# Altium footprint library 6-Connectors-2.PcbLib: 57 footprints (part 2 of 7)
Each footprint in its own frame and in the unit in brackets; x right, y up, seen from the top. Pads: shape width x height; smd on the part's side, far side on the other; paste and mask are expansions set on the pad; w line width, h text height; cw(c..) or ccw(c..) is an arc to the next point about the centre after c.
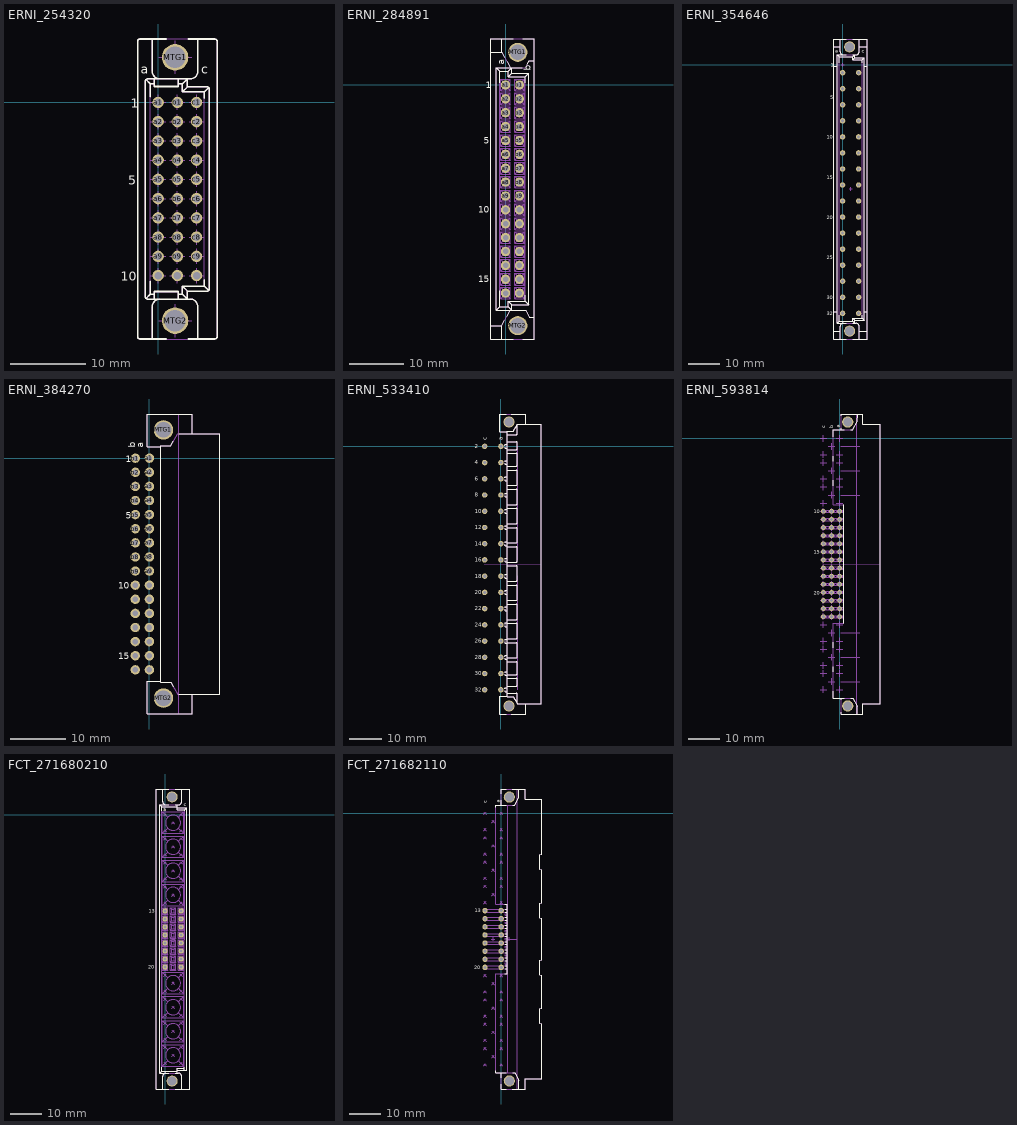
[diagram p1: the footprints below, top view; thin cyan lines are the x and y axes]

## ERNI_254320 [mm] "Connector; DIN 41612, Type C/3, Thru-Hole; Rows a+b+c, 30 Female Contacts"
height 11.6
pads (32):
  round 1.5 hole 1: a1(0,0) a2(0,-2.54) a3(0,-5.08) a4(0,-7.62) a5(0,-10.16) a6(0,-12.7) a7(0,-15.24) a8(0,-17.78) a9(0,-20.32) a10(0,-22.86) b1(2.54,0) b2(2.54,-2.54) b3(2.54,-5.08) b4(2.54,-7.62) b5(2.54,-10.16) b6(2.54,-12.7) b7(2.54,-15.24) b8(2.54,-17.78) b9(2.54,-20.32) b10(2.54,-22.86) c1(5.08,0) c2(5.08,-2.54) c3(5.08,-5.08) c4(5.08,-7.62) c5(5.08,-10.16) c6(5.08,-12.7) c7(5.08,-15.24) c8(5.08,-17.78) c9(5.08,-20.32) c10(5.08,-22.86)
  round 3.5 / inner round 3.5 / far side round 5.1 hole 2.8: MTG1(2.24,5.95) MTG2(2.24,-28.81)
Top Overlay:
  lines w0.2: -2.71,-29.139 -2.71,-28.996 -2.71,-28.643 -2.71,-28.5 ; -1.597,-25.872 -1.035,-25.31 ; -1.597,3.012 -1.035,2.45 ; -1.035,-23.6 -1.035,-25.31 ; -1.035,0.74 -1.035,2.45 ; -0.76,-31.23 -0.76,-26.96 cw(c0.24,-26.96) 0.24,-25.96 ; -0.76,8.37 -0.76,4.1 ccw(c0.24,4.1) 0.24,3.1 ; -0.485,-25.31 -1.035,-25.31 ; -0.485,2.45 -1.035,2.45 ; 1.08,-31.23 -2.41,-31.23 cw(c-2.41,-30.93) -2.71,-30.93 -2.71,8.07 cw(c-2.41,8.07) -2.41,8.37 1.08,8.37 ; 2.665,-25.96 2.665,-24.96 -0.485,-24.96 -0.485,-25.96 ; 2.665,-25.31 3.215,-25.31 ; 2.665,2.45 3.215,2.45 ; 2.665,3.1 2.665,2.1 -0.485,2.1 -0.485,3.1 ; 3.565,-25.96 ccw(c3.565,-25.66) 3.865,-25.66 3.865,-24.91 ; 3.565,3.1 cw(c3.565,2.8) 3.865,2.8 3.865,2.05 ; 3.777,-25.872 3.215,-25.31 ; 3.777,3.012 3.215,2.45 ; 4,-31.23 7.49,-31.23 ccw(c7.49,-30.93) 7.79,-30.93 7.79,8.07 ccw(c7.49,8.07) 7.49,8.37 4,8.37 ; 5.24,-31.23 5.24,-26.96 ccw(c4.24,-26.96) 4.24,-25.96 0.24,-25.96 ; 5.24,8.37 5.24,4.1 cw(c4.24,4.1) 4.24,3.1 0.24,3.1 ; 6.115,-23.425 6.115,-24.26 ; 6.115,0.565 6.115,1.4 ; 6.677,-24.822 6.115,-24.26 ; 6.677,1.962 6.115,1.4 ; 7.79,-29.139 7.79,-28.643 ; 7.79,5.64 7.79,5.783 ; -0.485,-25.96 0.24,-25.96 ; -0.485,-25.96 -1.385,-25.96 cw(c-1.385,-25.66) -1.685,-25.66 -1.685,-22.11 -1.685,-0.75 -1.685,2.8 cw(c-1.385,2.8) -1.385,3.1 -0.485,3.1 ; -0.485,3.1 0.24,3.1 ; 3.215,-25.31 3.215,-24.26 ; 3.215,-24.26 6.115,-24.26 ; 3.215,-24.26 3.865,-24.91 ; 3.215,1.4 6.115,1.4 ; 3.215,1.4 3.215,2.45 ; 3.215,1.4 3.865,2.05 ; 3.865,-24.91 6.465,-24.91 ccw(c6.465,-24.61) 6.765,-24.61 6.765,-22.11 6.765,-0.75 6.765,1.75 ccw(c6.465,1.75) 6.465,2.05 3.865,2.05
  text "c" at 5.715,3.81 h1.2
  text "a" at -2.286,3.81 h1.2
  text "1" at -3.585,-0.725 h1.2
  text "5" at -3.92,-10.885 h1.2
  text "10" at -4.918,-23.535 h1.2
Mechanical 8:
  lines w0.1: -1,-22.86 0,-22.86 ; -1,-20.32 0,-20.32 ; -1,-17.78 0,-17.78 ; -1,-15.24 0,-15.24 ; -1,-12.7 0,-12.7 ; -1,-10.16 0,-10.16 ; -1,-7.62 0,-7.62 ; -1,-5.08 0,-5.08 ; -1,-2.54 0,-2.54 ; -1,0 0,0 ; 0,-23.86 0,-22.86 ; 0,-21.86 0,-22.86 ; 0,-21.32 0,-20.32 ; 0,-19.32 0,-20.32 ; 0,-18.78 0,-17.78 ; 0,-16.78 0,-17.78 ; 0,-16.24 0,-15.24 ; 0,-14.24 0,-15.24 ; 0,-13.7 0,-12.7 ; 0,-11.7 0,-12.7 ; 0,-11.16 0,-10.16 ; 0,-9.16 0,-10.16 ; 0,-8.62 0,-7.62 ; 0,-6.62 0,-7.62 ; 0,-6.08 0,-5.08 ; 0,-4.08 0,-5.08 ; 0,-3.54 0,-2.54 ; 0,-1.54 0,-2.54 ; 0,-1 0,0 ; 0,1 0,0 ; 1,-22.86 0,-22.86 ; 1,-20.32 0,-20.32 ; 1,-17.78 0,-17.78 ; 1,-15.24 0,-15.24 ; 1,-12.7 0,-12.7 ; 1,-10.16 0,-10.16 ; 1,-7.62 0,-7.62 ; 1,-5.08 0,-5.08 ; 1,-2.54 0,-2.54 ; 1,0 0,0 ; 1.24,-28.81 2.24,-28.81 ; 1.24,5.95 2.24,5.95 ; 1.54,-22.86 2.54,-22.86 ; 1.54,-20.32 2.54,-20.32 ; 1.54,-17.78 2.54,-17.78 ; 1.54,-15.24 2.54,-15.24 ; 1.54,-12.7 2.54,-12.7 ; 1.54,-10.16 2.54,-10.16 ; 1.54,-7.62 2.54,-7.62 ; 1.54,-5.08 2.54,-5.08 ; 1.54,-2.54 2.54,-2.54 ; 1.54,0 2.54,0 ; 2.24,-29.81 2.24,-28.81 ; 2.24,-27.81 2.24,-28.81 ; 2.24,4.95 2.24,5.95 ; 2.24,6.95 2.24,5.95 ; 2.54,-23.86 2.54,-22.86 ; 2.54,-21.86 2.54,-22.86 ; 2.54,-21.32 2.54,-20.32 ; 2.54,-19.32 2.54,-20.32 ; 2.54,-18.78 2.54,-17.78 ; 2.54,-16.78 2.54,-17.78 ; 2.54,-16.24 2.54,-15.24 ; 2.54,-14.24 2.54,-15.24 ; 2.54,-13.7 2.54,-12.7 ; 2.54,-11.7 2.54,-12.7 ; 2.54,-11.16 2.54,-10.16 ; 2.54,-9.16 2.54,-10.16 ; 2.54,-8.62 2.54,-7.62 ; 2.54,-6.62 2.54,-7.62 ; 2.54,-6.08 2.54,-5.08 ; 2.54,-4.08 2.54,-5.08 ; 2.54,-3.54 2.54,-2.54 ; 2.54,-1.54 2.54,-2.54 ; 2.54,-1 2.54,0 ; 2.54,1 2.54,0 ; 3.24,-28.81 2.24,-28.81 ; 3.24,5.95 2.24,5.95 ; 3.54,-22.86 2.54,-22.86 ; 3.54,-20.32 2.54,-20.32 ; 3.54,-17.78 2.54,-17.78 ; 3.54,-15.24 2.54,-15.24 ; 3.54,-12.7 2.54,-12.7 ; 3.54,-10.16 2.54,-10.16 ; 3.54,-7.62 2.54,-7.62 ; 3.54,-5.08 2.54,-5.08 ; 3.54,-2.54 2.54,-2.54 ; 3.54,0 2.54,0 ; 4.08,-22.86 5.08,-22.86 ; 4.08,-20.32 5.08,-20.32 ; 4.08,-17.78 5.08,-17.78 ; 4.08,-15.24 5.08,-15.24 ; 4.08,-12.7 5.08,-12.7 ; 4.08,-10.16 5.08,-10.16 ; 4.08,-7.64 5.08,-7.64 ; 4.08,-5.08 5.08,-5.08 ; 4.08,-2.54 5.08,-2.54 ; 4.08,0 5.08,0 ; 5.08,-23.86 5.08,-22.86 ; 5.08,-21.86 5.08,-22.86 ; 5.08,-21.32 5.08,-20.32 ; 5.08,-19.32 5.08,-20.32 ; 5.08,-18.78 5.08,-17.78 ; 5.08,-16.78 5.08,-17.78 ; 5.08,-16.24 5.08,-15.24 ; 5.08,-14.24 5.08,-15.24 ; 5.08,-13.7 5.08,-12.7 ; 5.08,-11.7 5.08,-12.7 ; 5.08,-11.16 5.08,-10.16 ; 5.08,-9.16 5.08,-10.16 ; 5.08,-8.64 5.08,-7.64 ; 5.08,-6.64 5.08,-7.64 ; 5.08,-6.08 5.08,-5.08 ; 5.08,-4.08 5.08,-5.08 ; 5.08,-3.54 5.08,-2.54 ; 5.08,-1.54 5.08,-2.54 ; 5.08,-1 5.08,0 ; 5.08,1 5.08,0 ; 6.08,-22.86 5.08,-22.86 ; 6.08,-20.32 5.08,-20.32 ; 6.08,-17.78 5.08,-17.78 ; 6.08,-15.24 5.08,-15.24 ; 6.08,-12.7 5.08,-12.7 ; 6.08,-10.16 5.08,-10.16 ; 6.08,-7.64 5.08,-7.64 ; 6.08,-5.08 5.08,-5.08 ; 6.08,-2.54 5.08,-2.54 ; 6.08,0 5.08,0
Mechanical 14:
  circle w0.1: c2.24,5.95 r1.425
  circle w0.1: c2.24,-28.81 r1.425
  lines w0.1: -2.71,-29.139 -2.71,-28.996 -2.71,-28.643 -2.71,-28.5 ; -1.597,-25.872 -1.035,-25.31 ; -1.597,3.012 -1.035,2.45 ; -0.76,-31.23 -0.76,-26.96 cw(c0.24,-26.96) 0.24,-25.96 ; -0.76,8.37 -0.76,4.1 ccw(c0.24,4.1) 0.24,3.1 ; -0.485,-25.31 -1.035,-25.31 ; -0.485,2.45 -1.035,2.45 ; 0.065,-28.81 4.415,-28.81 ; 0.065,5.95 4.415,5.95 ; 2.24,-30.985 2.24,-26.635 ; 2.24,3.775 2.24,8.125 ; 2.665,-25.96 2.665,-24.96 -0.485,-24.96 -0.485,-25.96 ; 2.665,-25.31 3.215,-25.31 ; 2.665,2.45 3.215,2.45 ; 2.665,3.1 2.665,2.1 -0.485,2.1 -0.485,3.1 ; 3.565,-25.96 ccw(c3.565,-25.66) 3.865,-25.66 3.865,-24.91 ; 3.565,3.1 cw(c3.565,2.8) 3.865,2.8 3.865,2.05 ; 3.777,-25.872 3.215,-25.31 ; 3.777,3.012 3.215,2.45 ; 5.24,-31.23 5.24,-26.96 ccw(c4.24,-26.96) 4.24,-25.96 0.24,-25.96 ; 5.24,8.37 5.24,4.1 cw(c4.24,4.1) 4.24,3.1 0.24,3.1 ; 6.677,-24.822 6.115,-24.26 ; 6.677,1.962 6.115,1.4 ; 7.79,-29.139 7.79,-28.643 ; 7.79,5.64 7.79,5.783 ; -1.035,-25.31 -1.035,2.45 ; -0.485,-25.96 0.24,-25.96 ; -0.485,-25.96 -1.385,-25.96 cw(c-1.385,-25.66) -1.685,-25.66 -1.685,-22.11 -1.685,-0.75 -1.685,2.8 cw(c-1.385,2.8) -1.385,3.1 -0.485,3.1 ; -0.485,3.1 0.24,3.1 ; 3.215,-25.31 3.215,-24.26 ; 3.215,-24.26 6.115,-24.26 ; 3.215,-24.26 3.865,-24.91 ; 3.215,1.4 6.115,1.4 ; 3.215,1.4 3.215,2.45 ; 3.215,1.4 3.865,2.05 ; 3.865,-24.91 6.465,-24.91 ccw(c6.465,-24.61) 6.765,-24.61 6.765,-22.11 6.765,-0.75 6.765,1.75 ccw(c6.465,1.75) 6.465,2.05 3.865,2.05 ; 6.115,-24.26 6.115,1.4 ; -2.71,-30.93 ccw(c-2.41,-30.93) -2.41,-31.23 7.49,-31.23 ccw(c7.49,-30.93) 7.79,-30.93 7.79,8.07 ccw(c7.49,8.07) 7.49,8.37 -2.41,8.37 ccw(c-2.41,8.07) -2.71,8.07 -2.71,-30.93
  text "c" at 5.715,3.81 h1.2
  text "a" at -2.286,3.81 h1.2
  text "10" at -4.918,-23.535 h1.2
  text "1" at -3.585,-0.725 h1.2
  text "5" at -3.92,-10.885 h1.2
3D body "ERNI_254320.stp": height 11.6, standoff -4.5, extent -2.71,-31.23 7.79,8.37

## ERNI_284891 [mm] "DIN 41612, Type 2B, Thru-Hole Pressfit Terminations;  Rows a+b, 32 Positions, Performance level 2, Lead 4.5 mm, Pitch 2.54mm, Straight Female Connector"
height 11.6
pads (34):
  round 1.7 hole 1: a1(0,0) a2(0,-2.54) a3(0,-5.08) a4(0,-7.62) a5(0,-10.16) a6(0,-12.7) a7(0,-15.24) a8(0,-17.78) a9(0,-20.32) a10(0,-22.86) a11(0,-25.4) a12(0,-27.94) a13(0,-30.48) a14(0,-33.02) a15(0,-35.56) a16(0,-38.1) b1(2.54,0) b2(2.54,-2.54) b3(2.54,-5.08) b4(2.54,-7.62) b5(2.54,-10.16) b6(2.54,-12.7) b7(2.54,-15.24) b8(2.54,-17.78) b9(2.54,-20.32) b10(2.54,-22.86) b11(2.54,-25.4) b12(2.54,-27.94) b13(2.54,-30.48) b14(2.54,-33.02) b15(2.54,-35.56) b16(2.54,-38.1)
  round 3.5 / inner round 3.5 / far side round 5.1 hole 2.8: MTG1(2.24,5.95) MTG2(2.24,-44.05)
Top Overlay:
  lines w0.2: -2.73,-44.05 -0.71,-44.05 ; -2.73,5.95 -0.71,5.95 ; -1.08,-37.705 -1.08,-40.6 ; -1.08,0.395 -1.08,2.5 ; -0.71,-46.5 -0.71,-44.05 ; -0.71,8.4 -0.71,5.95 ; -0.214,-43.191 -0.71,-44.05 ; -0.214,5.091 -0.71,5.95 ; 0.269,-42.354 0.907,-41.25 3.653,-41.25 4.375,-42.5 5.27,-42.5 ; 0.269,4.254 0.907,3.15 3.025,3.15 ; 1.37,-46.5 -2.73,-46.5 -2.73,8.4 1.37,8.4 ; 3.11,-46.5 5.27,-46.5 5.27,8.4 3.11,8.4 ; 3.62,-38.495 3.62,-39.55 ; 3.62,0.395 3.62,1.45 ; 4.014,3.775 4.375,4.4 5.27,4.4 ; -1.73,-41.25 1.17,-41.25 ; -1.73,-41.25 -1.73,3.15 ; -1.73,-41.25 -1.08,-40.6 ; -1.73,3.15 1.17,3.15 ; -1.73,3.15 -1.08,2.5 ; -1.08,-40.6 0.52,-40.6 ; -1.08,2.5 0.52,2.5 ; 0.52,-40.6 0.52,-39.55 ; 0.52,-40.6 1.17,-41.25 ; 0.52,-39.55 3.62,-39.55 ; 0.52,-39.55 1.17,-40.2 ; 0.52,1.45 0.52,2.5 ; 0.52,1.45 3.62,1.45 ; 0.52,1.45 1.17,2.1 ; 0.52,2.5 1.17,3.15 ; 1.17,-41.25 1.17,-40.2 ; 1.17,-40.2 4.27,-40.2 ; 1.17,2.1 1.17,3.15 ; 1.17,2.1 4.27,2.1 ; 3.62,-39.55 4.27,-40.2 ; 3.62,1.45 4.27,2.1 ; 4.27,-40.2 4.27,2.1
  text "15" at -4.949,-36.13 h1.2
  text "1" at -3.64,-0.625 h1.2
  text "b" at 4.65,2.55 h1.2
  text "a" at -0.275,3.65 h1.2
  text "5" at -3.965,-10.785 h1.2
  text "10" at -4.949,-23.43 h1.2
Mechanical 8:
  lines w0.1: 0,-38.1 0,-37.6 0,-38.1 ; 0,-38.1 0.5,-38.1 0,-38.1 ; 0,-38.1 0,-38.6 0,-38.1 ; 0,-38.1 -0.5,-38.1 0,-38.1 ; 0,0 0,0.5 0,0 ; 0,0 0.5,0 0,0 ; 0,0 0,-0.5 0,0 ; 0,0 -0.5,0 0,0 ; 2.24,-44.05 2.24,-43.55 2.24,-44.05 ; 2.24,-44.05 2.74,-44.05 2.24,-44.05 ; 2.24,-44.05 2.24,-44.55 2.24,-44.05 ; 2.24,-44.05 1.74,-44.05 2.24,-44.05 ; 2.24,5.95 2.24,6.45 2.24,5.95 ; 2.24,5.95 2.74,5.95 2.24,5.95 ; 2.24,5.95 2.24,5.45 2.24,5.95 ; 2.24,5.95 1.74,5.95 2.24,5.95 ; 2.54,-38.1 2.54,-37.6 2.54,-38.1 ; 2.54,-38.1 3.04,-38.1 2.54,-38.1 ; 2.54,-38.1 2.54,-38.6 2.54,-38.1 ; 2.54,-38.1 2.04,-38.1 2.54,-38.1 ; 2.54,0 2.54,0.5 2.54,0 ; 2.54,0 3.04,0 2.54,0 ; 2.54,0 2.54,-0.5 2.54,0 ; 2.54,0 2.04,0 2.54,0
Mechanical 14:
  drawing of 426 lines, arcs and shapes, not listed
  text "15" at -4.949,-36.13 h1.2
  text "10" at -4.949,-23.43 h1.2
  text "5" at -3.965,-10.785 h1.2
  text "a" at -0.275,3.65 h1.2
  text "b" at 4.65,2.55 h1.2
  text "1" at -3.64,-0.625 h1.2
Drill Drawing:
  lines w0.1: -2.73,-39.5 -2.73,1.5 5.27,1.5 5.27,-39.5 -2.73,-39.5
  text "PRESS-FIT TECHNOLOGY diam. 1mm +0.09 -0.06" at -1.325,-37.125 h1
3D body "ERNI_284891.stp": height 11.6, standoff -4.5, extent -2.73,-46.5 5.27,8.4

## ERNI_354646 [mm] "DIN 41612, Type D, Thru-Hole Pressfit Termination; Rows a+c, 32 Position, Performance level 2, Lead 4.5mm, Pitch 5.08mm, Straight Female Connector"
height 11.6
pads (34):
  round 1.7 hole 1: a2(0,-2.54) a4(0,-7.62) a6(0,-12.7) a8(0,-17.78) a10(0,-22.86) a12(0,-27.94) a14(0,-33.02) a16(0,-38.1) a18(0,-43.18) a20(0,-48.26) a22(0,-53.34) a24(0,-58.42) a26(0,-63.5) a28(0,-68.58) a30(0,-73.66) a32(0,-78.74) c2(5.08,-2.54) c4(5.08,-7.62) c6(5.08,-12.7) c8(5.08,-17.78) c10(5.08,-22.86) c12(5.08,-27.94) c14(5.08,-33.02) c16(5.08,-38.1) c18(5.08,-43.18) c20(5.08,-48.26) c22(5.08,-53.34) c24(5.08,-58.42) c26(5.08,-63.5) c28(5.08,-68.58) c30(5.08,-73.66) c32(5.08,-78.74)
  round 3.5 / inner round 3.5 / far side round 5.1 hole 2.8: MTG1(2.24,5.63) MTG2(2.24,-84.37)
Top Overlay:
  lines w0.2: -2.76,-84.47 -0.76,-84.47 ; -2.76,-78.27 -1.71,-78.27 ; -2.76,-0.47 -1.71,-0.47 ; -2.76,5.73 -0.76,5.73 ; -1.11,-79.315 -1.11,-81.27 ; -1.11,0.575 -1.11,2.53 ; -0.76,-86.87 -0.76,-82.87 cw(c0.24,-82.87) 0.24,-81.87 1.22,-81.87 -1.71,-81.87 ; -0.76,8.13 -0.76,4.13 ccw(c0.24,4.13) 0.24,3.13 1.22,3.13 -1.71,3.13 ; 1.22,-86.87 -2.76,-86.87 -2.76,8.13 1.22,8.13 ; 3.26,-86.87 7.84,-86.87 7.84,8.13 3.26,8.13 ; 5.24,-86.87 5.24,-82.87 ccw(c4.24,-82.87) 4.24,-81.87 3.26,-81.87 3.79,-81.87 ; 5.24,-84.47 7.84,-84.47 ; 5.24,5.73 7.84,5.73 ; 5.24,8.13 5.24,4.13 cw(c4.24,4.13) 4.24,3.13 3.26,3.13 3.79,3.13 ; 6.19,-79.315 6.19,-80.27 ; 6.19,0.575 6.19,1.53 ; 6.79,-78.27 7.84,-78.27 ; 6.79,-0.47 7.84,-0.47 ; -1.71,-81.87 -1.71,3.13 ; -1.71,-81.87 -1.11,-81.27 ; -1.71,3.13 -1.11,2.53 ; -1.11,-81.27 3.19,-81.27 ; -1.11,2.53 3.19,2.53 ; 3.19,-81.27 3.19,-80.27 ; 3.19,-81.27 3.79,-81.87 ; 3.19,-80.27 6.19,-80.27 ; 3.19,-80.27 3.79,-80.87 ; 3.19,1.53 3.19,2.53 ; 3.19,1.53 6.19,1.53 ; 3.19,1.53 3.79,2.13 ; 3.19,2.53 3.79,3.13 ; 3.79,-81.87 3.79,-80.87 ; 3.79,-80.87 6.79,-80.87 ; 3.79,2.13 3.79,3.13 ; 3.79,2.13 6.79,2.13 ; 6.19,-80.27 6.79,-80.87 ; 6.19,1.53 6.79,2.13 ; 6.79,-80.87 6.79,2.13
  text "c" at 6.032,3.81 h1.2
  text "a" at -2.286,3.81 h1.2
  text "32" at -5.05,-79.415 h1.2
  text "5" at -3.925,-10.885 h1.2
  text "10" at -5.05,-23.535 h1.2
  text "30" at -5.05,-74.335 h1.2
  text "25" at -5.05,-61.635 h1.2
  text "20" at -5.05,-48.935 h1.2
  text "15" at -5.05,-36.235 h1.2
  text "1" at -3.725,-0.725 h1.2
Mechanical 8:
  lines w0.1: -0.5,-78.74 0,-78.74 ; -0.5,-73.66 0,-73.66 ; -0.5,-2.54 0,-2.54 ; -0.5,0 0,0 ; 0,-79.24 0,-78.74 ; 0,-78.24 0,-78.74 ; 0,-74.16 0,-73.66 ; 0,-73.16 0,-73.66 ; 0,-3.04 0,-2.54 ; 0,-2.04 0,-2.54 ; 0,-0.5 0,0 ; 0,0.5 0,0 ; 0.5,-78.74 0,-78.74 ; 0.5,-73.66 0,-73.66 ; 0.5,-2.54 0,-2.54 ; 0.5,0 0,0 ; 1.74,-84.37 2.24,-84.37 ; 1.74,5.63 2.24,5.63 ; 2.04,-39.37 2.54,-39.37 ; 2.24,-84.87 2.24,-84.37 ; 2.24,-83.87 2.24,-84.37 ; 2.24,5.13 2.24,5.63 ; 2.24,6.13 2.24,5.63 ; 2.54,-39.87 2.54,-39.37 ; 2.54,-38.87 2.54,-39.37 ; 2.74,-84.37 2.24,-84.37 ; 2.74,5.63 2.24,5.63 ; 3.04,-39.37 2.54,-39.37 ; 4.58,-78.74 5.08,-78.74 ; 4.58,-73.66 5.08,-73.66 ; 4.58,-2.54 5.08,-2.54 ; 5.08,-79.24 5.08,-78.74 ; 5.08,-78.24 5.08,-78.74 ; 5.08,-74.16 5.08,-73.66 ; 5.08,-73.16 5.08,-73.66 ; 5.08,-3.04 5.08,-2.54 ; 5.08,-2.04 5.08,-2.54 ; 5.58,-78.74 5.08,-78.74 ; 5.58,-73.66 5.08,-73.66 ; 5.58,-2.54 5.08,-2.54
Mechanical 14:
  circle w0.1: c2.24,-84.37 r1.4
  circle w0.1: c2.24,5.63 r1.4
  circle w0.1: c2.24,-84.37 r1.425
  circle w0.1: c2.24,5.63 r1.425
  lines w0.1: -2.76,-84.47 -0.76,-84.47 ; -2.76,-78.27 -1.71,-78.27 ; -2.76,-0.47 -1.71,-0.47 ; -2.76,5.73 -0.76,5.73 ; -0.76,-86.87 -0.76,-82.87 cw(c0.24,-82.87) 0.24,-81.87 4.24,-81.87 cw(c4.24,-82.87) 5.24,-82.87 5.24,-86.87 ; -0.76,8.13 -0.76,4.13 ccw(c0.24,4.13) 0.24,3.13 4.24,3.13 ccw(c4.24,4.13) 5.24,4.13 5.24,8.13 ; 5.24,-84.47 7.84,-84.47 ; 5.24,5.73 7.84,5.73 ; 6.79,-78.27 7.84,-78.27 ; 6.79,-0.47 7.84,-0.47 ; -1.71,-81.87 3.79,-81.87 ; -1.71,-81.87 -1.71,3.13 ; -1.71,-81.87 -1.11,-81.27 ; -1.71,3.13 3.79,3.13 ; -1.71,3.13 -1.11,2.53 ; -1.11,-81.27 3.19,-81.27 ; -1.11,-81.27 -1.11,2.53 ; -1.11,2.53 3.19,2.53 ; 3.19,-81.27 3.19,-80.27 ; 3.19,-81.27 3.79,-81.87 ; 3.19,-80.27 6.19,-80.27 ; 3.19,-80.27 3.79,-80.87 ; 3.19,1.53 3.19,2.53 ; 3.19,1.53 6.19,1.53 ; 3.19,1.53 3.79,2.13 ; 3.19,2.53 3.79,3.13 ; 3.79,-81.87 3.79,-80.87 ; 3.79,-80.87 6.79,-80.87 ; 3.79,2.13 3.79,3.13 ; 3.79,2.13 6.79,2.13 ; 6.19,-80.27 6.19,1.53 ; 6.19,-80.27 6.79,-80.87 ; 6.19,1.53 6.79,2.13 ; 6.79,-80.87 6.79,2.13 ; -2.76,-86.87 7.84,-86.87 7.84,8.13 -2.76,8.13 -2.76,-86.87
  text "1" at -3.725,-0.725 h1.2
  text "c" at 6.032,3.81 h1.2
  text "a" at -2.286,3.81 h1.2
  text "32" at -5.05,-79.415 h1.2
  text "5" at -3.925,-10.885 h1.2
  text "10" at -5.05,-23.535 h1.2
  text "15" at -5.05,-36.235 h1.2
  text "20" at -5.05,-48.935 h1.2
  text "25" at -5.05,-61.635 h1.2
  text "30" at -5.05,-74.335 h1.2
Drill Drawing:
  lines w0.1: -2.54,-58.42 -2.54,-81.28 7.62,-81.28 7.62,0 -2.54,0 -2.54,-20.32
  text "PRESS-FIT TECHNOLOGY diam. 1mm +0.09 -0.06" at -1.905,-56.515 h1
3D body "ERNI_354646.stp": height 11.5, standoff -4.3, extent -2.76,-86.87 7.84,8.13

## ERNI_384270 [mm] "DIN 41612, Type 2B, Thru-Hole Pressfit Terminations;  Rows a+b, 32 Positions, Performance Class 2, Lead 3 mm, Pitch 2.54mm, Right Angle Male Connector"
height 8.6
pads (34):
  round 1.7 hole 1: a1(0,0) a2(0,-2.54) a3(0,-5.08) a4(0,-7.62) a5(0,-10.16) a6(0,-12.7) a7(0,-15.24) a8(0,-17.78) a9(0,-20.32) a10(0,-22.86) a11(0,-25.4) a12(0,-27.94) a13(0,-30.48) a14(0,-33.02) a15(0,-35.56) a16(0,-38.1) b1(-2.54,0) b2(-2.54,-2.54) b3(-2.54,-5.08) b4(-2.54,-7.62) b5(-2.54,-10.16) b6(-2.54,-12.7) b7(-2.54,-15.24) b8(-2.54,-17.78) b9(-2.54,-20.32) b10(-2.54,-22.86) b11(-2.54,-25.4) b12(-2.54,-27.94) b13(-2.54,-30.48) b14(-2.54,-33.02) b15(-2.54,-35.56) b16(-2.54,-38.1)
  round 3.5 / inner round 3.5 / far side round 5.1 hole 2.8: MTG1(2.54,5.08) MTG2(2.54,-43.18)
Top Overlay:
  lines w0.2: 2.04,-40.18 -0.36,-40.18 -0.36,-46.05 7.69,-46.05 7.69,-42.5 ; 2.04,2.08 -0.36,2.08 -0.36,7.95 7.69,7.95 7.69,4.4 ; 4.32,-41.15 3.847,-40.33 2.04,-40.33 2.04,2.23 3.847,2.23 4.32,3.05 ; 5.3,-42.5 12.64,-42.5 12.64,4.4 5.3,4.4
  text "10" at -5.58,-23.535 h1.2
  text "5" at -4.255,-10.885 h1.2
  text "a" at -1.12,1.87 h1.2
  text "b" at -2.56,1.87 h1.2
  text "1" at -4.255,-0.725 h1.2
  text "15" at -5.58,-36.235 h1.2
Mechanical 8:
  drawing of 209 lines, arcs and shapes, not listed
  text "PCB" at 5.055,-19.45 h1.2
Mechanical 14:
  circle w0.1: c2.54,-43.18 r1.25
  circle w0.1: c2.54,5.08 r1.25
  lines w0.1: 2.04,-40.18 -0.36,-40.18 -0.36,-46.05 7.69,-46.05 7.69,-42.5 ; 2.04,2.08 -0.36,2.08 -0.36,7.95 7.69,7.95 7.69,4.4 ; 2.04,-40.33 2.04,2.23 3.847,2.23 5.1,4.4 12.64,4.4 12.64,-42.5 5.1,-42.5 3.847,-40.33 2.04,-40.33
  text "5" at -4.255,-10.885 h1.2
  text "1" at -4.255,-0.725 h1.2
  text "10" at -5.58,-23.535 h1.2
  text "15" at -5.58,-36.235 h1.2
Drill Drawing:
  lines w0.1: -3.9,-40.33 -3.9,2.08 1.4,2.08 1.4,-40.33 -3.9,-40.33
  text "PRESS-FIT TECHNOLOGY diam. 1mm +0.09 -0.06" at 3,-37.1 h1
3D body "v160-080.stp": height 0.02, standoff -1.65, extent -0.8,-38.9 0.8,-37.3
3D body "v160-080.stp": height 0.02, standoff -1.65, extent -3.34,-38.9 -1.74,-37.3
3D body "v160-080.stp": height 0.02, standoff -1.65, extent -0.8,-36.36 0.8,-34.76
3D body "v160-080.stp": height 0.02, standoff -1.65, extent -3.34,-36.36 -1.74,-34.76
3D body "v160-080.stp": height 0.02, standoff -1.65, extent -0.8,-33.82 0.8,-32.22
3D body "v160-080.stp": height 0.02, standoff -1.65, extent -3.34,-33.82 -1.74,-32.22
3D body "v160-080.stp": height 0.02, standoff -1.65, extent -0.8,-31.28 0.8,-29.68
3D body "v160-080.stp": height 0.02, standoff -1.65, extent -3.34,-31.28 -1.74,-29.68
3D body "v160-080.stp": height 0.02, standoff -1.65, extent -0.8,-28.74 0.8,-27.14
3D body "v160-080.stp": height 0.02, standoff -1.65, extent -3.34,-28.74 -1.74,-27.14
3D body "v160-080.stp": height 0.02, standoff -1.65, extent -0.8,-26.2 0.8,-24.6
3D body "v160-080.stp": height 0.02, standoff -1.65, extent -3.34,-26.2 -1.74,-24.6
3D body "v160-080.stp": height 0.02, standoff -1.65, extent -0.8,-23.66 0.8,-22.06
3D body "v160-080.stp": height 0.02, standoff -1.65, extent -3.34,-23.66 -1.74,-22.06
3D body "v160-080.stp": height 0.02, standoff -1.65, extent -0.8,-21.12 0.8,-19.52
3D body "v160-080.stp": height 0.02, standoff -1.65, extent -3.34,-21.12 -1.74,-19.52
3D body "v160-080.stp": height 0.02, standoff -1.65, extent -0.8,-18.58 0.8,-16.98
3D body "v160-080.stp": height 0.02, standoff -1.65, extent -3.34,-18.58 -1.74,-16.98
3D body "v160-080.stp": height 0.02, standoff -1.65, extent -0.8,-16.04 0.8,-14.44
3D body "v160-080.stp": height 0.02, standoff -1.65, extent -3.34,-16.04 -1.74,-14.44
3D body "v160-080.stp": height 0.02, standoff -1.65, extent -0.8,-13.5 0.8,-11.9
3D body "v160-080.stp": height 0.02, standoff -1.65, extent -3.34,-13.5 -1.74,-11.9
3D body "v160-080.stp": height 0.02, standoff -1.65, extent -0.8,-10.96 0.8,-9.36
3D body "v160-080.stp": height 0.02, standoff -1.65, extent -3.34,-10.96 -1.74,-9.36
3D body "v160-080.stp": height 0.02, standoff -1.65, extent -0.8,-8.42 0.8,-6.82
3D body "v160-080.stp": height 0.02, standoff -1.65, extent -3.34,-8.42 -1.74,-6.82
3D body "v160-080.stp": height 0.02, standoff -1.65, extent -0.8,-5.88 0.8,-4.28
3D body "v160-080.stp": height 0.02, standoff -1.65, extent -3.34,-5.88 -1.74,-4.28
3D body "v160-080.stp": height 0.02, standoff -1.65, extent -0.8,-3.34 0.8,-1.74
3D body "v160-080.stp": height 0.02, standoff -1.65, extent -3.34,-3.34 -1.74,-1.74
3D body "v160-080.stp": height 0.02, standoff -1.65, extent -0.8,-0.8 0.8,0.8
3D body "v160-080.stp": height 0.02, standoff -1.65, extent -3.34,-0.8 -1.74,0.8
3D body "ERNI_384270.stp": height 6.83, standoff -3, extent -2.79,-46.05 12.64,7.95

## ERNI_533410 [mm] "Eurocard DIN 41612, Type C, 32 Position, Rows a+c, Performance level 2, Male, Lead 3.0 mm, Pitch 2.54 mm"
height 11
pads (34):
  round 1.7 hole 1: a2(0,0) a4(0,-5.08) a6(0,-10.16) a8(0,-15.24) a10(0,-20.32) a12(0,-25.4) a14(0,-30.48) a16(0,-35.56) a18(0,-40.64) a20(0,-45.72) a22(0,-50.8) a24(0,-55.88) a26(0,-60.96) a28(0,-66.04) a30(0,-71.12) a32(0,-76.2) c2(-5.08,0) c4(-5.08,-5.08) c6(-5.08,-10.16) c8(-5.08,-15.24) c10(-5.08,-20.32) c12(-5.08,-25.4) c14(-5.08,-30.48) c16(-5.08,-35.56) c18(-5.08,-40.64) c20(-5.08,-45.72) c22(-5.08,-50.8) c24(-5.08,-55.88) c26(-5.08,-60.96) c28(-5.08,-66.04) c30(-5.08,-71.12) c32(-5.08,-76.2)
  round 3.5 / inner round 3.5 / far side round 5.1 hole 2.8: MTG1(2.54,7.62) MTG2(2.54,-81.28)
Top Overlay:
  drawing of 163 lines, arcs and shapes, not listed
  text "2" at -8.12,-0.575 h1.2
  text "4" at -8.12,-5.655 h1.2
  text "6" at -8.12,-10.735 h1.2
  text "8" at -8.22,-15.815 h1.2
  text "12" at -8.22,-25.975 h1.2
  text "14" at -8.22,-31.055 h1.2
  text "16" at -8.22,-36.135 h1.2
  text "18" at -8.22,-41.215 h1.2
  text "22" at -8.22,-51.375 h1.2
  text "24" at -8.22,-56.455 h1.2
  text "26" at -8.22,-61.535 h1.2
  text "c" at -4.445,1.905 h1.2
  text "a" at 0.635,1.905 h1.2
  text "32" at -8.22,-76.775 h1.2
  text "10" at -8.22,-20.895 h1.2
  text "20" at -8.22,-46.295 h1.2
  text "28" at -8.22,-66.615 h1.2
  text "30" at -8.22,-71.695 h1.2
Mechanical 8:
  lines w0.1: -5.08,-36.83 12.64,-36.83
  text "PCB" at 5.08,-38.735 h1.2
Mechanical 14:
  drawing of 163 lines, arcs and shapes, not listed
  text "PCB" at 6.05,-40.1 h1.2
  text "a" at 0.635,1.905 h1.2
  text "c" at -4.445,1.905 h1.2
  text "30" at -8.22,-71.695 h1.2
  text "28" at -8.22,-66.615 h1.2
  text "20" at -8.22,-46.295 h1.2
  text "10" at -8.22,-20.895 h1.2
  text "32" at -8.22,-76.775 h1.2
  text "26" at -8.22,-61.535 h1.2
  text "24" at -8.22,-56.455 h1.2
  text "22" at -8.22,-51.375 h1.2
  text "18" at -8.22,-41.215 h1.2
  text "16" at -8.22,-36.135 h1.2
  text "14" at -8.22,-31.055 h1.2
  text "12" at -8.22,-25.975 h1.2
  text "8" at -8.22,-15.815 h1.2
  text "6" at -8.12,-10.735 h1.2
  text "4" at -8.12,-5.655 h1.2
  text "2" at -8.12,-0.575 h1.2
3D body "v160-080.stp": height 0.02, standoff -1.65, extent -0.8,-77 0.8,-75.4
3D body "v160-080.stp": height 0.02, standoff -1.65, extent -5.88,-77 -4.28,-75.4
3D body "v160-080.stp": height 0.02, standoff -1.65, extent -0.8,-71.92 0.8,-70.32
3D body "v160-080.stp": height 0.02, standoff -1.65, extent -5.88,-71.92 -4.28,-70.32
3D body "v160-080.stp": height 0.02, standoff -1.65, extent -0.8,-66.84 0.8,-65.24
3D body "v160-080.stp": height 0.02, standoff -1.65, extent -5.88,-66.84 -4.28,-65.24
3D body "v160-080.stp": height 0.02, standoff -1.65, extent -0.8,-61.76 0.8,-60.16
3D body "v160-080.stp": height 0.02, standoff -1.65, extent -5.88,-61.76 -4.28,-60.16
3D body "v160-080.stp": height 0.02, standoff -1.65, extent -0.8,-56.68 0.8,-55.08
3D body "v160-080.stp": height 0.02, standoff -1.65, extent -5.88,-56.68 -4.28,-55.08
3D body "v160-080.stp": height 0.02, standoff -1.65, extent -0.8,-51.6 0.8,-50
3D body "v160-080.stp": height 0.02, standoff -1.65, extent -5.88,-51.6 -4.28,-50
3D body "v160-080.stp": height 0.02, standoff -1.65, extent -0.8,-46.52 0.8,-44.92
3D body "v160-080.stp": height 0.02, standoff -1.65, extent -5.88,-46.52 -4.28,-44.92
3D body "v160-080.stp": height 0.02, standoff -1.65, extent -0.8,-41.44 0.8,-39.84
3D body "v160-080.stp": height 0.02, standoff -1.65, extent -5.88,-41.44 -4.28,-39.84
3D body "v160-080.stp": height 0.02, standoff -1.65, extent -0.8,-36.36 0.8,-34.76
3D body "v160-080.stp": height 0.02, standoff -1.65, extent -5.88,-36.36 -4.28,-34.76
3D body "v160-080.stp": height 0.02, standoff -1.65, extent -0.8,-31.28 0.8,-29.68
3D body "v160-080.stp": height 0.02, standoff -1.65, extent -5.88,-31.28 -4.28,-29.68
3D body "v160-080.stp": height 0.02, standoff -1.65, extent -0.8,-26.2 0.8,-24.6
3D body "v160-080.stp": height 0.02, standoff -1.65, extent -5.88,-26.2 -4.28,-24.6
3D body "v160-080.stp": height 0.02, standoff -1.65, extent -0.8,-21.12 0.8,-19.52
3D body "v160-080.stp": height 0.02, standoff -1.65, extent -5.88,-21.12 -4.28,-19.52
3D body "v160-080.stp": height 0.02, standoff -1.65, extent -0.8,-16.04 0.8,-14.44
3D body "v160-080.stp": height 0.02, standoff -1.65, extent -5.88,-16.04 -4.28,-14.44
3D body "v160-080.stp": height 0.02, standoff -1.65, extent -0.8,-10.96 0.8,-9.36
3D body "v160-080.stp": height 0.02, standoff -1.65, extent -5.88,-10.96 -4.28,-9.36
3D body "v160-080.stp": height 0.02, standoff -1.65, extent -0.8,-5.88 0.8,-4.28
3D body "v160-080.stp": height 0.02, standoff -1.65, extent -5.88,-5.88 -4.28,-4.28
3D body "v160-080.stp": height 0.02, standoff -1.65, extent -0.8,-0.8 0.8,0.8
3D body "v160-080.stp": height 0.02, standoff -1.65, extent -5.88,-0.8 -4.28,0.8
3D body "ERNI_533410.stp": height 9.4, standoff -3, extent -5.38,-83.83 12.64,10.17

## ERNI_593814 [mm] "DIN 41612, Type M, 42 Contacts + 6 Spares  Positions for Specials Contacts, Right Angle Male Connector, Pitch 2.54 mm"
height 11
pads (44):
  round 1.5 hole 1: a10(0,-22.86) a11(0,-25.4) a12(0,-27.94) a13(0,-30.48) a14(0,-33.02) a15(0,-35.56) a16(0,-38.1) a17(0,-40.64) a18(0,-43.18) a19(0,-45.72) a20(0,-48.26) a21(0,-50.8) a22(0,-53.34) a23(0,-55.88) b10(-2.54,-22.86) b11(-2.54,-25.4) b12(-2.54,-27.94) b13(-2.54,-30.48) b14(-2.54,-33.02) b15(-2.54,-35.56) b16(-2.54,-38.1) b17(-2.54,-40.64) b18(-2.54,-43.18) b19(-2.54,-45.72) b20(-2.54,-48.26) b21(-2.54,-50.8) b22(-2.54,-53.34) b23(-2.54,-55.88) c10(-5.08,-22.86) c11(-5.08,-25.4) c12(-5.08,-27.94) c13(-5.08,-30.48) c14(-5.08,-33.02) c15(-5.08,-35.56) c16(-5.08,-38.1) c17(-5.08,-40.64) c18(-5.08,-43.18) c19(-5.08,-45.72) c20(-5.08,-48.26) c21(-5.08,-50.8) c22(-5.08,-53.34) c23(-5.08,-55.88)
  round 3.5 / inner round 3.5 / far side round 5.1 hole 2.8: MTG1(2.54,5.08) MTG2(2.54,-83.82)
Top Overlay:
  lines w0.2: -1.965,0.46 -1.96,2.63 1.5,2.63 ; -1.963,-73.2 -1.96,-71.58 ; -1.963,-65.58 -1.96,-63.96 ; -1.963,-14.78 -1.96,-13.16 ; -1.963,-7.16 -1.96,-5.54 ; -1.955,-79.2 -1.96,-81.37 1.5,-81.37 ; 0.54,-85.857 0.54,-86.37 7.24,-86.37 7.24,-83.17 12.74,-83.17 12.74,4.43 7.24,4.43 7.24,7.63 0.54,7.63 0.54,7.117 ; 0.54,-81.883 0.54,-81.37 ; 0.54,2.63 0.54,3.143 ; 1.29,-57.94 1.29,-20.8 ; 3.5,-81.37 4.04,-81.37 5.54,-83.87 5.54,-86.37 ; 3.5,2.63 4.04,2.63 5.54,5.13 5.64,7.63
  text "c" at -4.58,3.22 h1.2
  text "b" at -2.04,3.22 h1.2
  text "a" at 0,3.302 h1.2
  text "10" at -8.12,-23.535 h1.2
  text "15" at -8.12,-36.235 h1.2
  text "20" at -8.12,-48.935 h1.2
Mechanical 8:
  drawing of 314 lines, arcs and shapes, not listed
  text "PCB" at 5.08,-41.275 h1.2
Mechanical 14:
  lines w0.1: 0.54,-81.37 0.54,-86.37 7.24,-86.37 7.24,-83.17 12.74,-83.17 12.74,4.43 7.24,4.43 7.24,7.63 0.54,7.63 0.54,2.63 ; 1.29,-56.23 -5.38,-56.23 -5.38,-55.53 1.295,-55.53 ; 1.29,-53.69 -5.38,-53.69 -5.38,-52.99 1.295,-52.99 ; 1.29,-51.15 -5.38,-51.15 -5.38,-50.45 1.295,-50.45 ; 1.29,-48.61 -5.38,-48.61 -5.38,-47.91 1.295,-47.91 ; 1.29,-46.07 -5.38,-46.07 -5.38,-45.37 1.295,-45.37 ; 1.29,-43.53 -5.38,-43.53 -5.38,-42.83 1.295,-42.83 ; 1.29,-40.99 -5.38,-40.99 -5.38,-40.29 1.295,-40.29 ; 1.29,-38.45 -5.38,-38.45 -5.38,-37.75 1.295,-37.75 ; 1.29,-35.91 -5.38,-35.91 -5.38,-35.21 1.295,-35.21 ; 1.29,-33.37 -5.38,-33.37 -5.38,-32.67 1.295,-32.67 ; 1.29,-30.83 -5.38,-30.83 -5.38,-30.13 1.295,-30.13 ; 1.29,-28.29 -5.38,-28.29 -5.38,-27.59 1.295,-27.59 ; 1.29,-25.75 -5.38,-25.75 -5.38,-25.05 1.295,-25.05 ; 1.29,-23.21 -5.38,-23.21 -5.38,-22.51 1.295,-22.51 ; 5.54,-86.37 5.54,-83.87 4.04,-81.37 -1.96,-81.37 -1.96,-57.94 1.29,-57.94 1.29,-20.8 -1.96,-20.8 -1.96,2.63 4.04,2.63 5.54,5.13 5.64,7.63
  text "10" at -8.12,-23.535 h1.2
  text "20" at -8.12,-48.935 h1.2
3D body "v160-080.stp": height 0.02, standoff -1.65, extent -0.8,-56.68 0.8,-55.08
3D body "v160-080.stp": height 0.02, standoff -1.65, extent -3.34,-56.68 -1.74,-55.08
3D body "v160-080.stp": height 0.02, standoff -1.65, extent -5.88,-56.68 -4.28,-55.08
3D body "v160-080.stp": height 0.02, standoff -1.65, extent -0.8,-54.14 0.8,-52.54
3D body "v160-080.stp": height 0.02, standoff -1.65, extent -3.34,-54.14 -1.74,-52.54
3D body "v160-080.stp": height 0.02, standoff -1.65, extent -5.88,-54.14 -4.28,-52.54
3D body "v160-080.stp": height 0.02, standoff -1.65, extent -0.8,-51.6 0.8,-50
3D body "v160-080.stp": height 0.02, standoff -1.65, extent -3.34,-51.6 -1.74,-50
3D body "v160-080.stp": height 0.02, standoff -1.65, extent -5.88,-51.6 -4.28,-50
3D body "v160-080.stp": height 0.02, standoff -1.65, extent -0.8,-49.06 0.8,-47.46
3D body "v160-080.stp": height 0.02, standoff -1.65, extent -3.34,-49.06 -1.74,-47.46
3D body "v160-080.stp": height 0.02, standoff -1.65, extent -5.88,-49.06 -4.28,-47.46
3D body "v160-080.stp": height 0.02, standoff -1.65, extent -0.8,-46.52 0.8,-44.92
3D body "v160-080.stp": height 0.02, standoff -1.65, extent -3.34,-46.52 -1.74,-44.92
3D body "v160-080.stp": height 0.02, standoff -1.65, extent -5.88,-46.52 -4.28,-44.92
3D body "v160-080.stp": height 0.02, standoff -1.65, extent -0.8,-43.98 0.8,-42.38
3D body "v160-080.stp": height 0.02, standoff -1.65, extent -3.34,-43.98 -1.74,-42.38
3D body "v160-080.stp": height 0.02, standoff -1.65, extent -5.88,-43.98 -4.28,-42.38
3D body "v160-080.stp": height 0.02, standoff -1.65, extent -0.8,-41.44 0.8,-39.84
3D body "v160-080.stp": height 0.02, standoff -1.65, extent -3.34,-41.44 -1.74,-39.84
3D body "v160-080.stp": height 0.02, standoff -1.65, extent -5.88,-41.44 -4.28,-39.84
3D body "v160-080.stp": height 0.02, standoff -1.65, extent -0.8,-38.9 0.8,-37.3
3D body "v160-080.stp": height 0.02, standoff -1.65, extent -3.34,-38.9 -1.74,-37.3
3D body "v160-080.stp": height 0.02, standoff -1.65, extent -5.88,-38.9 -4.28,-37.3
3D body "v160-080.stp": height 0.02, standoff -1.65, extent -0.8,-36.36 0.8,-34.76
3D body "v160-080.stp": height 0.02, standoff -1.65, extent -3.34,-36.36 -1.74,-34.76
3D body "v160-080.stp": height 0.02, standoff -1.65, extent -5.88,-36.36 -4.28,-34.76
3D body "v160-080.stp": height 0.02, standoff -1.65, extent -0.8,-33.82 0.8,-32.22
3D body "v160-080.stp": height 0.02, standoff -1.65, extent -3.34,-33.82 -1.74,-32.22
3D body "v160-080.stp": height 0.02, standoff -1.65, extent -5.88,-33.82 -4.28,-32.22
3D body "v160-080.stp": height 0.02, standoff -1.65, extent -0.8,-31.28 0.8,-29.68
3D body "v160-080.stp": height 0.02, standoff -1.65, extent -3.34,-31.28 -1.74,-29.68
3D body "v160-080.stp": height 0.02, standoff -1.65, extent -5.88,-31.28 -4.28,-29.68
3D body "v160-080.stp": height 0.02, standoff -1.65, extent -0.8,-28.74 0.8,-27.14
3D body "v160-080.stp": height 0.02, standoff -1.65, extent -3.34,-28.74 -1.74,-27.14
3D body "v160-080.stp": height 0.02, standoff -1.65, extent -5.88,-28.74 -4.28,-27.14
3D body "v160-080.stp": height 0.02, standoff -1.65, extent -0.8,-26.2 0.8,-24.6
3D body "v160-080.stp": height 0.02, standoff -1.65, extent -3.34,-26.2 -1.74,-24.6
3D body "v160-080.stp": height 0.02, standoff -1.65, extent -5.88,-26.2 -4.28,-24.6
3D body "v160-080.stp": height 0.02, standoff -1.65, extent -0.8,-23.66 0.8,-22.06
3D body "v160-080.stp": height 0.02, standoff -1.65, extent -3.34,-23.66 -1.74,-22.06
3D body "v160-080.stp": height 0.02, standoff -1.65, extent -5.88,-23.66 -4.28,-22.06
3D body "ERNI_593814.stp": height 9.4, standoff -3, extent -5.38,-86.37 12.74,7.63

## FCT_271680210 [mm] "DIN 41612, Type M, 16 Contacts (Row ac) + 8 Spares  Positions for Specials Contacts, Straight Female Connector, Pitch 2.54 mm"
height 12.6
pads (18):
  round 1.7 hole 1: a13(0,-30.48) a14(0,-33.02) a15(0,-35.56) a16(0,-38.1) a17(0,-40.64) a18(0,-43.18) a19(0,-45.72) a20(0,-48.26) c13(5.08,-30.48) c14(5.08,-33.02) c15(5.08,-35.56) c16(5.08,-38.1) c17(5.08,-40.64) c18(5.08,-43.18) c19(5.08,-45.72) c20(5.08,-48.26)
  round 3.5 / inner round 3.5 / far side round 5.1 hole 2.8: MTG1(2.24,5.63) MTG2(2.24,-84.37)
Top Overlay:
  lines w0.2: -1.651,-81.811 -1.11,-81.27 ; -1.651,3.071 -1.11,2.53 ; -1.11,-79.99 -1.11,-81.27 ; -1.11,1.25 -1.11,2.53 ; -0.76,-86.866 -0.76,-82.87 cw(c0.24,-82.87) 0.24,-81.87 1.22,-81.87 -1.71,-81.87 -1.71,3.13 1.22,3.13 0.24,3.13 cw(c0.24,4.13) -0.76,4.13 -0.76,8.13 ; 1.22,-86.87 -2.76,-86.87 -2.76,8.13 1.22,8.13 ; 3.26,-86.87 7.84,-86.87 7.84,8.13 3.26,8.13 ; 3.79,-81.27 -1.11,-81.27 ; 3.79,2.53 -1.11,2.53 ; 5.24,-86.863 5.24,-82.87 ccw(c4.24,-82.87) 4.24,-81.87 3.26,-81.87 3.79,-81.87 3.79,-80.87 ; 5.24,8.13 5.24,4.13 cw(c4.24,4.13) 4.24,3.13 3.26,3.13 3.79,3.13 3.79,2.13 ; 6.04,-80.87 6.042,-79.99 ; 6.04,-80.27 3.79,-80.27 3.79,-80.87 ; 6.189,1.25 6.19,1.53 ; 6.731,2.071 6.19,1.53 ; 3.79,-80.87 6.79,-80.87 6.79,2.13 3.79,2.13 ; 3.79,2.13 3.79,1.53 6.19,1.53
  text "20" at -5.345,-48.8 h1.2
  text "13" at -5.14,-31.055 h1.2
  text "c" at 5.88,2.71 h1.2
  text "a" at -0.526,1.135 h1.2
Mechanical 8:
  drawing of 236 lines, arcs and shapes, not listed
Mechanical 14:
  drawing of 395 lines, arcs and shapes, not listed
3D body "FCT_271680210.stp": height 13.05, standoff -3.55, extent -2.76,-86.87 7.84,8.13

## FCT_271682110 [mm] "DIN 41612, Type M, 16 Contacts (Row ac) + 8 Spares  Positions for Specials Contacts, Right Angle Male Connector, Pitch 2.54 mm"
height 11.1
pads (18):
  round 1.7 hole 1: a13(0,-30.48) a14(0,-33.02) a15(0,-35.56) a16(0,-38.1) a17(0,-40.64) a18(0,-43.18) a19(0,-45.72) a20(0,-48.26) c13(-5.08,-30.48) c14(-5.08,-33.02) c15(-5.08,-35.56) c16(-5.08,-38.1) c17(-5.08,-40.64) c18(-5.08,-43.18) c19(-5.08,-45.72) c20(-5.08,-48.26)
  round 3.5 / inner round 3.5 / far side round 5.1 hole 2.8: MTG1(2.54,5.08) MTG2(2.54,-83.82)
Top Overlay:
  lines w0.2: -1.76,-80.59 -1.76,-81.32 0.04,-81.32 ; -1.76,1.85 -1.76,2.58 0.04,2.58 ; 0.04,-84.84 0.04,-86.37 1.653,-86.37 ; 0.04,-82.8 0.04,-81.32 ; 0.04,4.06 0.04,2.58 ; 0.04,6.1 0.04,7.63 1.653,7.63 ; 1.175,-50.29 1.84,-50.29 1.84,-28.45 1.175,-28.45 ; 1.25,-48.71 1.84,-48.71 ; 1.25,-47.81 1.84,-47.81 ; 1.25,-46.17 1.84,-46.17 ; 1.25,-45.27 1.84,-45.27 ; 1.25,-43.63 1.84,-43.63 ; 1.25,-42.73 1.84,-42.73 ; 1.25,-41.09 1.84,-41.09 ; 1.25,-40.19 1.84,-40.19 ; 1.25,-38.55 1.84,-38.55 ; 1.25,-37.65 1.84,-37.65 ; 1.25,-36.01 1.84,-36.01 ; 1.25,-35.11 1.84,-35.11 ; 1.25,-33.47 1.84,-33.47 ; 1.25,-32.57 1.84,-32.57 ; 1.25,-30.93 1.84,-30.93 ; 1.25,-30.03 1.84,-30.03 ; 1.52,-81.32 0.04,-81.32 ; 1.52,2.58 0.04,2.58 ; 3.427,-86.37 7.54,-86.37 7.54,-83.12 12.74,-83.12 12.74,-65.961 12.14,-65.8 12.14,-61.2 12.74,-61.039 12.74,-50.721 12.14,-50.56 12.14,-45.96 12.74,-45.799 12.74,-32.941 12.14,-32.78 12.14,-28.18 12.74,-28.019 12.74,-17.701 12.14,-17.54 12.14,-12.94 12.74,-12.779 12.74,4.38 7.54,4.38 7.54,7.63 3.427,7.63 ; 3.56,-81.32 4.214,-81.32 5.54,-83.616 5.54,-86.37 ; 3.56,2.58 4.214,2.58 5.54,4.876 5.54,7.63
  text "c" at -4.58,3.22 h1.2
  text "a" at -0.425,3.252 h1.2
  text "13" at -8.27,-31.055 h1.2
  text "20" at -8.475,-48.8 h1.2
Mechanical 8:
  drawing of 241 lines, arcs and shapes, not listed
  text "PCB" at 6.585,-41.2 h1.2
Mechanical 14:
  circle w0.1: c2.54,-83.82 r1.275
  circle w0.1: c2.54,5.08 r1.275
  lines w0.1: 1.84,-48.71 -5.38,-48.71 -5.38,-47.81 1.84,-47.81 ; 1.84,-47.213 1.34,-47.213 1.34,-46.767 1.84,-46.767 ; 1.84,-46.17 -5.38,-46.17 -5.38,-45.27 1.84,-45.27 ; 1.84,-44.673 1.34,-44.673 1.34,-44.227 1.84,-44.227 ; 1.84,-43.63 -5.38,-43.63 -5.38,-42.73 1.84,-42.73 ; 1.84,-42.133 1.34,-42.133 1.34,-41.687 1.84,-41.687 ; 1.84,-41.09 -5.38,-41.09 -5.38,-40.19 1.84,-40.19 ; 1.84,-39.593 1.34,-39.593 1.34,-39.147 1.84,-39.147 ; 1.84,-38.55 -5.38,-38.55 -5.38,-37.65 1.84,-37.65 ; 1.84,-37.053 1.34,-37.053 1.34,-36.607 1.84,-36.607 ; 1.84,-36.01 -5.38,-36.01 -5.38,-35.11 1.84,-35.11 ; 1.84,-34.513 1.34,-34.513 1.34,-34.067 1.84,-34.067 ; 1.84,-33.47 -5.38,-33.47 -5.38,-32.57 1.84,-32.57 ; 1.84,-31.973 1.34,-31.973 1.34,-31.527 1.84,-31.527 ; 1.84,-30.93 -5.38,-30.93 -5.38,-30.03 1.84,-30.03 ; 2.04,-81.32 2.04,2.58 ; 5.54,-86.37 5.54,-83.616 4.214,-81.32 0.04,-81.32 ; 5.54,7.63 5.54,4.876 4.214,2.58 0.04,2.58 ; 0.04,-81.32 0.04,-86.37 7.54,-86.37 7.54,-83.12 12.74,-83.12 12.74,-65.961 12.14,-65.8 12.14,-61.2 12.74,-61.039 12.74,-50.721 12.14,-50.56 12.14,-45.96 12.74,-45.799 12.74,-32.941 12.14,-32.78 12.14,-28.18 12.74,-28.019 12.74,-17.701 12.14,-17.54 12.14,-12.94 12.74,-12.779 12.74,4.38 7.54,4.38 7.54,7.63 0.04,7.63 0.04,2.58 ; 0.04,-81.32 -1.76,-81.32 -1.76,-50.29 1.84,-50.29 1.84,-28.45 -1.76,-28.45 -1.76,2.58 0.04,2.58
3D body "v160-080.stp": height 0.02, standoff -1.65, extent -0.8,-49.06 0.8,-47.46
3D body "v160-080.stp": height 0.02, standoff -1.65, extent -5.88,-49.06 -4.28,-47.46
3D body "v160-080.stp": height 0.02, standoff -1.65, extent -0.8,-46.52 0.8,-44.92
3D body "v160-080.stp": height 0.02, standoff -1.65, extent -5.88,-46.52 -4.28,-44.92
3D body "v160-080.stp": height 0.02, standoff -1.65, extent -0.8,-43.98 0.8,-42.38
3D body "v160-080.stp": height 0.02, standoff -1.65, extent -5.88,-43.98 -4.28,-42.38
3D body "v160-080.stp": height 0.02, standoff -1.65, extent -0.8,-41.44 0.8,-39.84
3D body "v160-080.stp": height 0.02, standoff -1.65, extent -5.88,-41.44 -4.28,-39.84
3D body "v160-080.stp": height 0.02, standoff -1.65, extent -0.8,-38.9 0.8,-37.3
3D body "v160-080.stp": height 0.02, standoff -1.65, extent -5.88,-38.9 -4.28,-37.3
3D body "v160-080.stp": height 0.02, standoff -1.65, extent -0.8,-36.36 0.8,-34.76
3D body "v160-080.stp": height 0.02, standoff -1.65, extent -5.88,-36.36 -4.28,-34.76
3D body "v160-080.stp": height 0.02, standoff -1.65, extent -0.8,-33.82 0.8,-32.22
3D body "v160-080.stp": height 0.02, standoff -1.65, extent -5.88,-33.82 -4.28,-32.22
3D body "v160-080.stp": height 0.02, standoff -1.65, extent -0.8,-31.28 0.8,-29.68
3D body "v160-080.stp": height 0.02, standoff -1.65, extent -5.88,-31.28 -4.28,-29.68
3D body "FCT_271682110.stp": height 9.38, standoff -2.95, extent -5.38,-86.37 12.74,7.63